# Altium footprint library dAir.PcbLib: 34 footprints (part 1 of 3)
Each footprint in its own frame and in the unit in brackets; x right, y up, seen from the top. Pads: shape width x height; smd on the part's side, far side on the other; paste and mask are expansions set on the pad; w line width, h text height; cw(c..) or ccw(c..) is an arc to the next point about the centre after c.
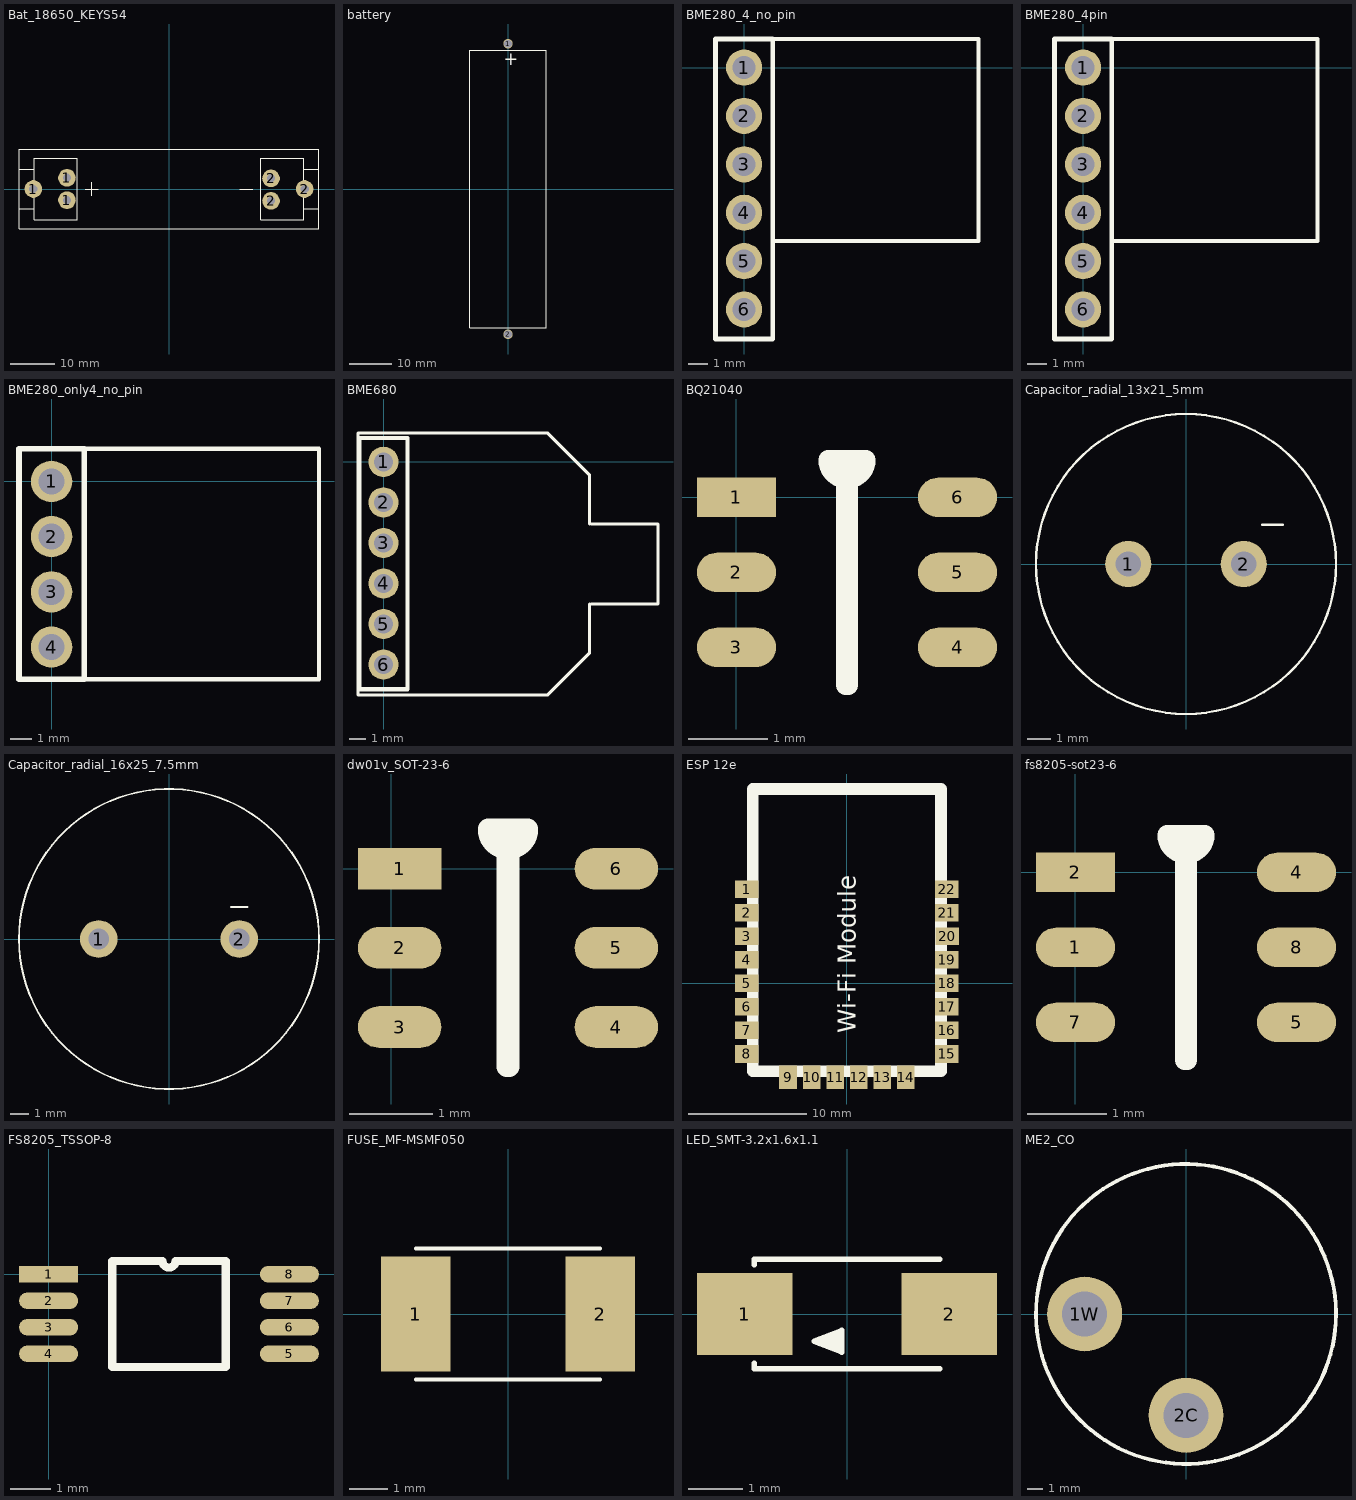
[diagram p0: the footprints below, top view; thin cyan lines are the x and y axes]

## Bat_18650_KEYS54 [mm]
pads (6):
  round 4 hole 1.9: 1(-30.75,0) 1(-23.13,-2.54) 1(-23.13,2.54) 2(23.13,-2.677) 2(23.13,2.403) 2(30.75,0)
Top Overlay:
  lines w0.2: -19,0 -16,0 ; -17.5,-1.5 -17.5,1.5 ; 16,0 19,0 ; -30.5,-4.5 -30.5,-7 -20.75,-7 -20.75,7 -30.5,7 -30.5,4.5 ; -30.5,-4.5 -30.5,0 -30.5,4.5 ; -30.5,-4.5 -34,-4.5 -34,0 -34,4.5 -30.5,4.5 ; 30.5,-4.5 30.5,-7 20.75,-7 20.75,7 30.5,7 30.5,4.5 ; 30.5,-4.5 34,-4.5 34,0 34,4.5 30.5,4.5 ; 30.5,-4.5 30.5,0 30.5,4.5 ; -34,-9 34,-9 34,9 -34,9 -34,-9
3D body "User Library-li-ion.step": height 19, standoff 1, extent -32.8,-9 32.8,9
3D body "User Library-keystone-PN54.step": height 18, standoff -3.35, extent 21,-9.051 34.007,9.051
3D body "User Library-keystone-PN54.step": height 18, standoff -3.35, extent -34.007,-9.051 -21,9.051

## battery [mm]
pads (2):
  round 2.2 hole 1.8: 1(0,34) 2(0,-34)
Top Overlay:
  lines w0.254: -9,-32.5 9,-32.5 9,32.5 -9,32.5 -9,-32.5
  text "+" at -1,29 h3

## BME280_4_no_pin [mm]
pads (6):
  round 1.9 hole 1.2: 1(0,0) 2(0,-2.54) 3(0,-5.08) 4(0,-7.62) 5(0,-10.16) 6(0,-12.7)
Top Overlay:
  lines w0.2: 1.5,1.5 12.3,1.5 12.3,-9.1 1.6,-9.1
  lines w0.254: -1.5,-14.25 1.5,-14.25 1.5,1.5 -1.5,1.5 -1.5,-14.25
3D body "User Library-GY-BME280.step": height 2.53, standoff -1.1, extent -1.5,-9.15 12.021,1.55

## BME280_4pin [mm]
pads (6):
  round 1.9 hole 1.2: 1(0,0) 2(0,-2.54) 3(0,-5.08) 4(0,-7.62) 5(0,-10.16) 6(0,-12.7)
Top Overlay:
  lines w0.2: 1.5,1.5 12.3,1.5 12.3,-9.1 1.6,-9.1
  lines w0.254: -1.5,-14.25 1.5,-14.25 1.5,1.5 -1.5,1.5 -1.5,-14.25
3D body "Sensor BME280.stp": height 6.93, standoff -4.04, extent -1.25,-9.1 12.25,1.4

## BME280_only4_no_pin [mm]
pads (4):
  round 1.9 hole 1.2: 1(0,0) 2(0,-2.54) 3(0,-5.08) 4(0,-7.62)
Top Overlay:
  lines w0.2: 1.5,1.5 12.3,1.5 12.3,-9.1 1.6,-9.1
  lines w0.254: -1.5,-9.1 -1.5,1.5 1.5,1.5 1.5,-9.1 -1.5,-9.1
3D body "User Library-GY-BME280.step": height 3.73, standoff 0.1, extent -1.5,-9.15 12.021,1.55

## BME680 [mm]
pads (6):
  round 1.9 hole 1.2: 1(0,0) 2(0,-2.54) 3(0,-5.08) 4(0,-7.62) 5(0,-10.16) 6(0,-12.7)
Top Overlay:
  lines w0.2: 12.9,-8.9 12.9,-12 10.3,-14.6 -1.6,-14.6 -1.6,1.8 10.3,1.8 12.9,-0.8 12.9,-3.9 ; 13,-8.9 17.2,-8.9 17.2,-3.9 13,-3.9
  lines w0.254: -1.5,-14.25 -1.5,1.5 1.5,1.5 1.5,-14.25 -1.5,-14.25
3D body "CJMCU-680.STEP": height 5.3, standoff -5.78, extent -1.55,-14.55 17.15,1.75

## BQ21040 [mm]
pads (6):
  rect 1x0.5 smd: 1(0,0)
  oval 1x0.5 smd: 2(0,-0.95) 3(0,-1.9) 4(2.8,-1.9) 5(2.8,-0.95) 6(2.8,0)
Top Overlay:
  lines w0.25: 1.162,0.475 ccw(c1.4,0.475) 1.637,0.475 1.415,0.475 1.415,-2.375 1.385,-2.375 1.385,0.475 1.162,0.475

## Capacitor_radial_13x21_5mm [mm]
pads (2):
  round 2 hole 1.1: 1(-2.5,0) 2(2.5,0)
Top Overlay:
  circle w0.1: c0,0 r6.5
  lines w0.1: 3.3,1.7 4.2,1.7
3D body "User Library-Electrolytic capacitro Radial 13X21_RM5.step": height 21.5, standoff -2.5, extent -6.1,-6.1 6.101,6.1

## Capacitor_radial_16x25_7.5mm [mm]
pads (2):
  round 2 hole 1.1: 1(-3.75,0) 2(3.75,0)
Top Overlay:
  circle w0.1: c0,0 r8
  lines w0.1: 3.3,1.7 4.2,1.7
3D body "User Library-CE_R300_D650_H1000.step": height 26.1, standoff -2.8, extent -8.25,-8.25 8.25,8.25

## dw01v_SOT-23-6 [mm]
pads (6):
  rect 1x0.5 smd: 1(0.1,0)
  oval 1x0.5 smd: 2(0.1,-0.95) 3(0.1,-1.9) 4(2.7,-1.9) 5(2.7,-0.95) 6(2.7,0)
Top Overlay:
  lines w0.25: 1.162,0.475 ccw(c1.4,0.475) 1.637,0.475 1.415,0.475 1.415,-2.375 1.385,-2.375 1.385,0.475 1.162,0.475
3D body "User Library-sot-23-6-2.step": height 1.09, standoff 0, extent 0.187,-2.347 2.613,0.447

## ESP 12e [mm]
pads (22):
  rect 2x1.5 smd: 1(-8.51,7.99) 2(-8.51,5.99) 3(-8.51,3.99) 4(-8.51,1.99) 5(-8.51,-0.01) 6(-8.51,-2.01) 7(-8.51,-4.01) 8(-8.51,-6.01) 15(8.49,-6.01) 16(8.49,-4.01) 17(8.49,-2.01) 18(8.49,-0.01) 19(8.49,1.99) 20(8.51,3.99) 21(8.49,5.99) 22(8.49,7.99)
  rect 1.5x2 smd: 9(-5.01,-7.99) 10(-3.01,-7.99) 11(-1.01,-7.99) 12(0.99,-7.99) 13(2.99,-7.99) 14(4.99,-7.99)
Top Overlay:
  lines w1: -8.01,-7.49 7.99,-7.49 7.99,16.51 -8.01,16.51 -8.01,-7.49
  text "Wi-Fi Module" at 0.725,-4.25 h1.52

## fs8205-sot23-6 [mm]
pads (6):
  oval 1x0.5 smd: 1(0,-0.95) 4(2.8,0) 5(2.8,-1.9) 7(0,-1.9) 8(2.8,-0.95)
  rect 1x0.5 smd: 2(0,0)
Top Overlay:
  lines w0.25: 1.162,0.475 ccw(c1.4,0.475) 1.637,0.475 1.415,0.475 1.415,-2.375 1.385,-2.375 1.385,0.475 1.162,0.475

## FS8205_TSSOP-8 [mm]
pads (8):
  rect 1.45x0.4 smd: 1(0,0)
  oval 1.45x0.4 smd: 2(0,-0.65) 3(0,-1.3) 4(0,-1.95) 5(5.9,-1.95) 6(5.9,-1.3) 7(5.9,-0.65) 8(5.9,0)
Top Overlay:
  lines w0.2: 1.56,-2.275 1.56,0.325 2.788,0.325 ccw(c2.95,0.325) 3.112,0.325 4.34,0.325 4.34,-2.275 1.56,-2.275
3D body "User Library-tsop8.step": height 1.2, standoff 0, extent -0.2,-2.55 6.2,0.55

## FUSE_MF-MSMF050 [mm]
pads (2):
  rect 1.8x3 smd: 1(-2.4,0) 2(2.4,0)
Top Overlay:
  lines w0.1: -2.4,-1.7 2.4,-1.7 ; -2.4,1.7 2.4,1.7
3D body: height 0.75, standoff 0, extent -2.25,-1.625 2.25,1.625

## LED_SMT-3.2x1.6x1.1 [mm]
pads (2):
  rect 1.75x1.5 smd: 1(-1.875,0) 2(1.875,0)
Top Overlay:
  region: -0.6,-0.5 -0.35,-0.4 -0.1,-0.3 -0.1,-0.7 -0.35,-0.6
  lines w0.1: -1.7,-0.9 -1.7,-1 1.7,-1 ; -1.7,0.9 -1.7,1 1.7,1 ; -0.6,-0.5 -0.1,-0.7 -0.1,-0.3 -0.6,-0.5
3D body "User Library-5977703607F.step": height 1.1, standoff -0.04, extent -1.6,-0.8 1.6,0.8

## ME2_CO [mm]
pads (2):
  round 5 hole 3: 1W(-6.755,0) 2C(0,-6.755)
Top Overlay:
  lines w0.254: 10,0 cw(c0,0) 9.999,0.114
3D body "ME2-CO.STEP": height 18.4, standoff -2.3, extent -10,-9.48 10,10.521